# Altium footprint library SENSOR.PcbLib: 76 footprints (part 4 of 5)
Each footprint in its own frame and in the unit in brackets; x right, y up, seen from the top. Pads: shape width x height; smd on the part's side, far side on the other; paste and mask are expansions set on the pad; w line width, h text height; cw(c..) or ccw(c..) is an arc to the next point about the centre after c.
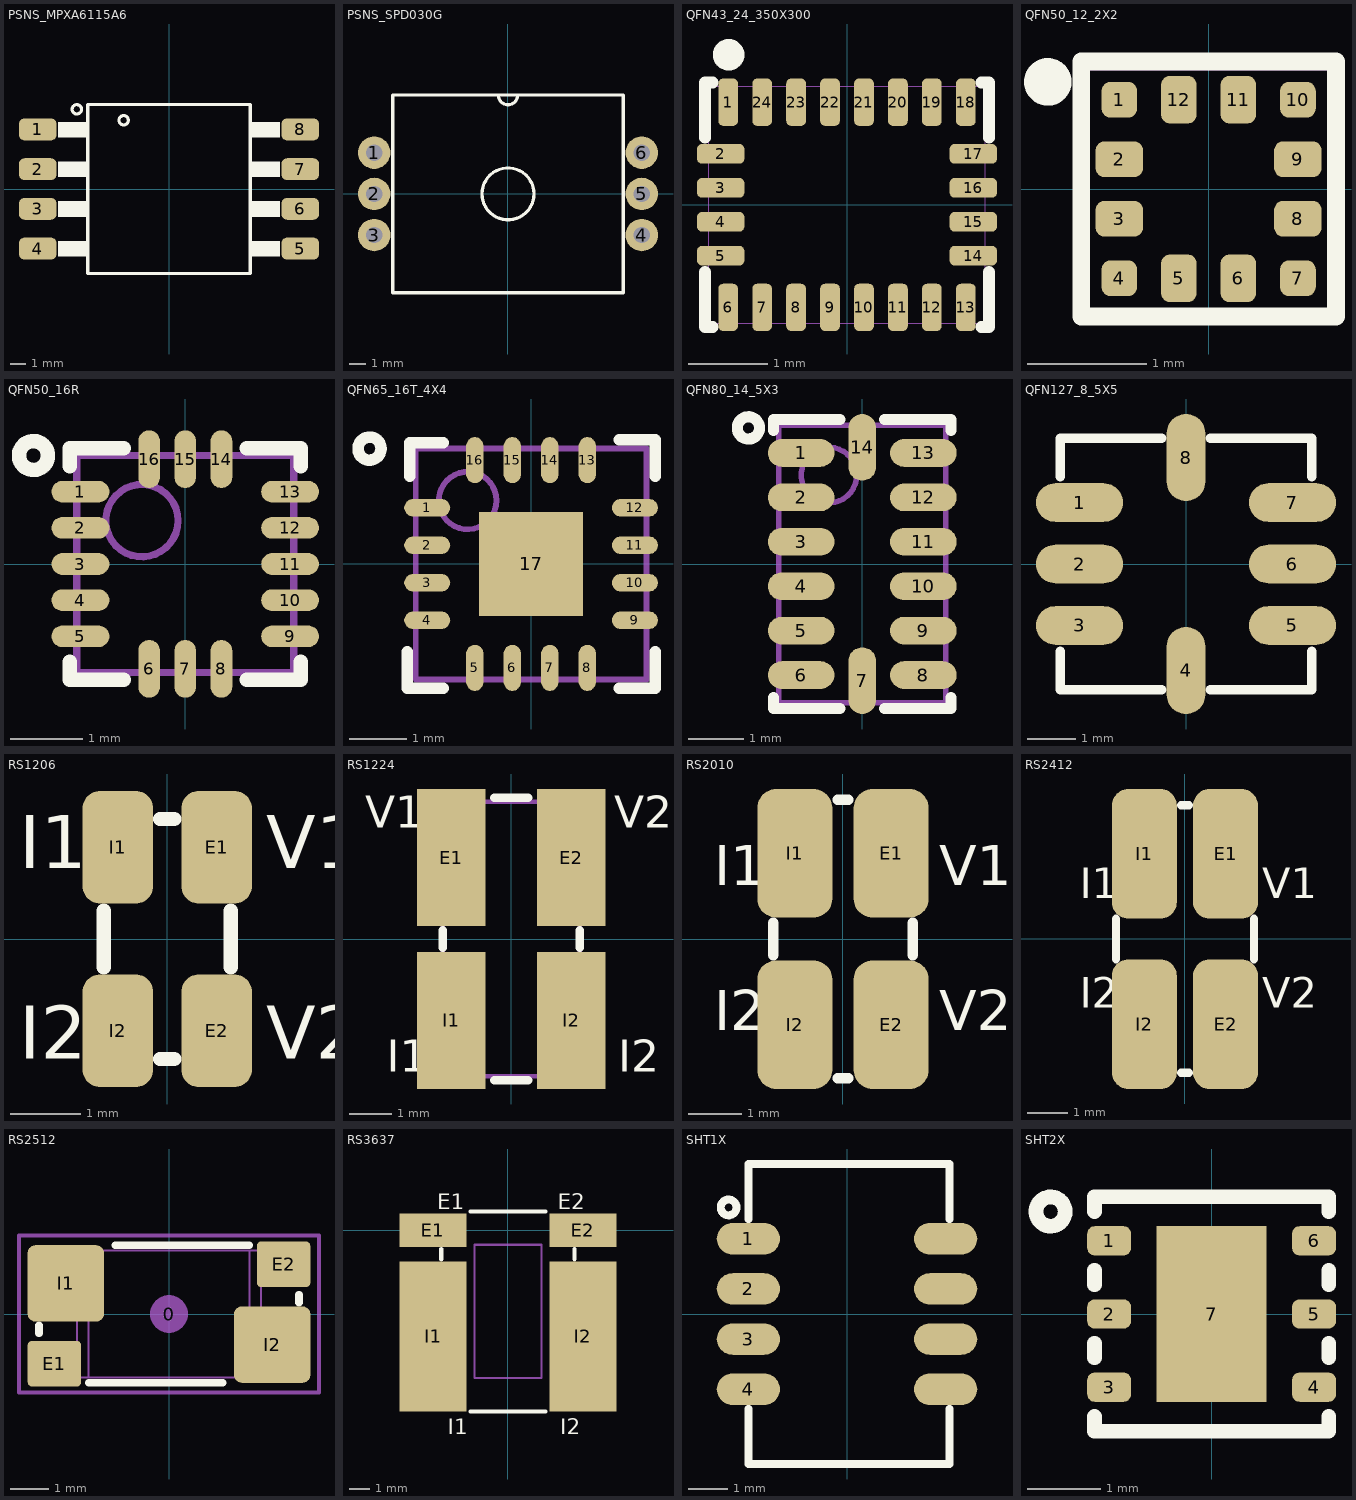
[diagram p3: the footprints below, top view; thin cyan lines are the x and y axes]

## PSNS_MPXA6115A6 [mm] "Pressure Sensor, MPXA6115A6"
pads (8):
  rrect50% 2.4x1.4 smd: 1(-8.4,3.81) 2(-8.4,1.27) 3(-8.4,-1.27) 4(-8.4,-3.81) 5(8.4,-3.81) 6(8.4,-1.27) 7(8.4,1.27) 8(8.4,3.81)
Top Overlay:
  circle w0.2: c-5.9,5.1 r0.3
  circle w0.2: c-2.9,4.4 r0.3
  region: 7.1,4.3 5.2,4.3 5.2,3.3 7.1,3.3
  region: 7.1,1.76 5.2,1.76 5.2,0.76 7.1,0.76
  region: 7.1,-0.78 5.2,-0.78 5.2,-1.78 7.1,-1.78
  region: 7.1,-3.32 5.2,-3.32 5.2,-4.32 7.1,-4.32
  rectangle: -7.1,-4.32 -5.2,-3.32
  rectangle: -7.1,-1.78 -5.2,-0.78
  rectangle: -7.1,0.76 -5.2,1.76
  rectangle: -7.1,3.3 -5.2,4.3
  lines w0.2: -5.2,-5.4 5.2,-5.4 5.2,5.4 -5.2,5.4 -5.2,-5.4
3D body "User Library-MPXV6115V.step": height 13, standoff 0, extent -9.1,-5.65 9.1,5.65

## PSNS_SPD030G [mm] "Pressure Sensor, SPD030G"
pads (6):
  round 2 hole 1: 1(-8.25,2.54) 2(-8.25,0) 3(-8.25,-2.54) 4(8.25,-2.54) 5(8.25,0) 6(8.25,2.54)
Top Overlay:
  circle w0.2: c0,0 r1.6
  lines w0.2: -0.6,6.1 ccw(c0,6.1) 0.6,6.1 ; -7.1,-6.1 -7.1,6.1 7.1,6.1 7.1,-6.1 -7.1,-6.1
3D body: height 4, standoff 0, extent -7,-6 7,6
3D body: height 15, standoff 3, extent -1.5,-1.498 1.5,1.499

## QFN43_24_350X300 [mm] "LGA (3.5x3x1 mm) 24-lead, LSM9DS1 gyro"
height 1
pads (24):
  rrect50% 0.25x0.6 smd paste-0.025 mask+0.05: 1(-1.505,1.3) 6(-1.505,-1.3) 7(-1.075,-1.3) 8(-0.645,-1.3) 9(-0.215,-1.3) 10(0.215,-1.3) 11(0.645,-1.3) 12(1.075,-1.3) 13(1.505,-1.3) 18(1.505,1.3) 19(1.075,1.3) 20(0.645,1.3) 21(0.215,1.3) 22(-0.215,1.3) 23(-0.645,1.3) 24(-1.075,1.3)
  rrect50% 0.6x0.25 smd paste-0.025 mask+0.05: 2(-1.6,0.645) 3(-1.6,0.215) 4(-1.6,-0.215) 5(-1.6,-0.645) 14(1.6,-0.645) 15(1.6,-0.215) 16(1.6,0.215) 17(1.6,0.645)
Top Overlay:
  circle w0.2: c-1.5,1.9 r0.1
  lines w0.15: -1.8,-0.85 -1.8,-1.55 -1.7,-1.55 ; -1.8,0.85 -1.8,1.55 -1.7,1.55 ; 1.7,-1.55 1.8,-1.55 1.8,-0.85 ; 1.7,1.55 1.8,1.55 1.8,0.85
Mechanical 13:
  lines w0.01: -1.75,-1.5 1.75,-1.5 1.75,1.5 -1.75,1.5 -1.75,-1.5
3D body: height 1.01, standoff 1, extent -1.4,0.7 -1,1.1
3D body: height 0.05, standoff 0, extent -0.335,1.05 -0.095,1.4
3D body: height 0.05, standoff 0, extent -1.625,1.05 -1.385,1.4
3D body: height 0.05, standoff 0, extent -1.195,1.05 -0.955,1.4
3D body: height 0.05, standoff 0, extent -0.765,1.05 -0.525,1.4
3D body: height 0.05, standoff 0, extent 0.955,1.05 1.195,1.4
3D body: height 0.05, standoff 0, extent 0.525,1.05 0.765,1.4
3D body: height 0.05, standoff 0, extent 0.095,1.05 0.335,1.4
3D body: height 0.05, standoff 0, extent 1.385,1.05 1.625,1.4
3D body: height 0.05, standoff 0, extent 1.385,-1.4 1.625,-1.05
3D body: height 0.05, standoff 0, extent 0.095,-1.4 0.335,-1.05
3D body: height 0.05, standoff 0, extent 0.525,-1.4 0.765,-1.05
3D body: height 0.05, standoff 0, extent 0.955,-1.4 1.195,-1.05
3D body: height 0.05, standoff 0, extent -0.765,-1.4 -0.525,-1.05
3D body: height 0.05, standoff 0, extent -1.195,-1.4 -0.955,-1.05
3D body: height 0.05, standoff 0, extent -1.625,-1.4 -1.385,-1.05
3D body: height 0.05, standoff 0, extent -0.335,-1.4 -0.095,-1.05
3D body: height 0.05, standoff 0, extent 1.35,-0.335 1.7,-0.095
3D body: height 0.05, standoff 0, extent 1.35,0.095 1.7,0.335
3D body: height 0.05, standoff 0, extent 1.35,0.525 1.7,0.765
3D body: height 0.05, standoff 0, extent 1.35,-0.765 1.7,-0.525
3D body: height 0.05, standoff 0, extent -1.7,-0.765 -1.35,-0.525
3D body: height 0.05, standoff 0, extent -1.7,0.525 -1.35,0.765
3D body: height 0.05, standoff 0, extent -1.7,0.095 -1.35,0.335
3D body: height 0.05, standoff 0, extent -1.7,-0.335 -1.35,-0.095
3D body: height 1, standoff 0.01, extent -1.75,-1.5 1.75,1.5

## QFN50_12_2X2 [mm] "LGA, 12-Leads, Body 2.00x2.00mmx1.00mm, Pitch 0.50mm"
height 1
pads (12):
  rrect50% 0.3x0.3 smd paste-0.05 mask+0.075: 1(-0.75,0.75) 4(-0.75,-0.75) 7(0.75,-0.75) 10(0.75,0.75)
  rrect50% 0.4x0.3 smd paste-0.05 mask+0.075: 2(-0.75,0.25) 3(-0.75,-0.25) 8(0.75,-0.25) 9(0.75,0.25)
  rrect50% 0.3x0.4 smd paste-0.05 mask+0.075: 5(-0.25,-0.75) 6(0.25,-0.75) 11(0.25,0.75) 12(-0.25,0.75)
Top Overlay:
  circle w0.2: c-1.35,0.9 r0.1
  lines w0.15: -1.07,-1.07 1.07,-1.07 1.07,1.07 -1.07,1.07 -1.07,-1.07
Mechanical 13:
  lines w0.01: -1,-1 1,-1 1,1 -1,1 -1,-1
3D body "User Library-lga-2x2x0_9.step": height 0.95, standoff 0, extent -1,-1 1,1

## QFN50_16R [mm] "TFLGA 3x3x1, 5+3+5+3, 3X3mm, 0.5mm pitch"
height 1
pads (16):
  oval 0.8x0.3 smd paste-0.05 mask+0.075: 1(-1.45,1) 2(-1.45,0.5) 3(-1.45,0) 4(-1.45,-0.5) 5(-1.45,-1) 9(1.45,-1) 10(1.45,-0.5) 11(1.45,0) 12(1.45,0.5) 13(1.45,1)
  oval 0.3x0.8 smd paste-0.05 mask+0.075: 6(-0.5,-1.45) 7(0,-1.45) 8(0.5,-1.45) 14(0.5,1.45) 15(0,1.45) 16(-0.5,1.45)
Top Overlay:
  circle w0.2: c-2.1,1.5 r0.2
  lines w0.2: -1.6,-1.35 -1.6,-1.6 -0.85,-1.6 ; -1.6,1.35 -1.6,1.6 -0.85,1.6 ; 0.85,-1.6 1.6,-1.6 1.6,-1.35 ; 0.85,1.6 1.6,1.6 1.6,1.35
Mechanical 13:
  circle w0.1: c-0.6,0.6 r0.5
  lines w0.1: -1.5,-1.5 1.5,-1.5 1.5,1.5 -1.5,1.5 -1.5,-1.5
3D body: height 1, standoff 0, extent -1.5,-1.5 1.5,1.5

## QFN65_16T_4X4 [mm] "QFN, 16-Leads, Body 4.00x4.00mm, Pitch 0.65mm, ADX330"
height 1.5
pads (17):
  oval 0.8x0.3 smd mask+0.075: 1(-1.8,0.975) 2(-1.8,0.325) 3(-1.8,-0.325) 4(-1.8,-0.975) 9(1.8,-0.975) 10(1.8,-0.325) 11(1.8,0.325) 12(1.8,0.975)
  oval 0.3x0.8 smd mask+0.075: 5(-0.975,-1.8) 6(-0.325,-1.8) 7(0.325,-1.8) 8(0.975,-1.8) 13(0.975,1.8) 14(0.325,1.8) 15(-0.325,1.8) 16(-0.975,1.8)
  rect 1.8x1.8 smd paste-0.1: 17(0,0)
Top Overlay:
  circle w0.2: c-2.8,2 r0.2
  lines w0.2: -2.15,-1.525 -2.15,-2.15 -1.525,-2.15 ; -2.1,1.525 -2.1,2.1 -1.525,2.1 ; 1.525,-2.15 2.15,-2.15 2.15,-1.525 ; 1.525,2.15 2.15,2.15 2.15,1.525
Mechanical 13:
  circle w0.1: c-1.1,1.1 r0.5
  lines w0.1: -2,-2 -2,2 2,2 2,-2 -2,-2
3D body "QFN65_16T_4X4.step": height 1.5, standoff 0, extent -2.02,-2.02 2.02,2.02

## QFN80_14_5X3 [mm] "QFN LGA 5.0X3.0mm, pitch: 0.8mm, ADXL345"
height 1
pads (14):
  oval 1.2x0.5 smd paste-0.05 mask+0.075: 1(-1.1,2) 2(-1.1,1.2) 3(-1.1,0.4) 4(-1.1,-0.4) 5(-1.1,-1.2) 6(-1.1,-2) 8(1.1,-2) 9(1.1,-1.2) 10(1.1,-0.4) 11(1.1,0.4) 12(1.1,1.2) 13(1.1,2)
  oval 0.5x1.2 smd paste-0.05 mask+0.075: 7(0,-2.1) 14(0,2.1)
Top Overlay:
  circle w0.2: c-2.05,2.45 r0.2
  lines w0.2: -1.6,-2.4 -1.6,-2.6 -0.4,-2.6 ; -1.6,2.4 -1.6,2.6 -0.4,2.6 ; 0.4,-2.6 1.6,-2.6 1.6,-2.4 ; 0.4,2.6 1.6,2.6 1.6,2.4
Mechanical 13:
  circle w0.1: c-0.6,1.6 r0.5
  lines w0.1: -1.5,-2.5 -1.5,2.5 1.5,2.5 1.5,-2.5 -1.5,-2.5
3D body "QFN80_14_5X3.step": height 1, standoff 0, extent -1.5,-2.5 1.5,2.5

## QFN127_8_5X5 [mm] "E-8-1, LCC 8, ADXL103, ADXL203"
pads (8):
  oval 1.8x0.8 smd paste-0.05: 1(-2.2,1.27) 2(-2.2,0) 3(-2.2,-1.27) 5(2.2,-1.27) 6(2.2,0) 7(2.2,1.27)
  oval 0.8x1.8 smd paste-0.05: 4(0,-2.2) 8(0,2.2)
Top Overlay:
  lines w0.2: -2.6,-1.8 -2.6,-2.6 -0.5,-2.6 ; -2.6,1.8 -2.6,2.6 -0.5,2.6 ; 0.5,-2.6 2.6,-2.6 2.6,-1.8 ; 0.5,2.6 2.6,2.6 2.6,1.8
3D body "User Library-LCC-8.step": height 1.55, standoff 0, extent -2.5,-2.5 2.5,2.5

## RS1206 [mm] "RESISTOR SHUNT SMD, 3.2X1.6mm, 1206, LVK12"
height 0.5
pads (4):
  rrect50% 1x1.6 smd: E1(0.7,1.3) E2(0.7,-1.3) I1(-0.7,1.3) I2(-0.7,-1.3)
Top Overlay:
  lines w0.2: -0.9,-0.4 -0.9,0.4 ; -0.1,-1.7 0.1,-1.7 ; -0.1,1.7 0.1,1.7 ; 0.9,-0.4 0.9,0.4
  text "V1" at 1.4,1 h0.75
  text "I1" at -2.1,1 h0.75
  text "V2" at 1.4,-1.7 h0.75
  text "I2" at -2.1,-1.7 h0.75
3D body "LVK12R010FER.stp": height 0.6, standoff 0.05, extent -0.8,-1.6 0.8,1.6

## RS1224 [mm] "RESISTOR SHUNT SMD, 6.4X3.2mm, 1224, LVK25R005FER"
pads (4):
  rect 1.6x3.2 smd: E1(-1.4,1.9) E2(1.4,1.9) I1(-1.4,-1.9) I2(1.4,-1.9)
Top Overlay:
  lines w0.2: -1.6,-0.2 -1.6,0.2 ; -0.4,-3.3 0.4,-3.3 ; -0.4,3.3 0.4,3.3 ; 1.6,-0.2 1.6,0.2
  text "V1" at -3.4,2.6 h0.75
  text "I1" at -2.9,-3.1 h0.75
  text "V2" at 2.4,2.6 h0.75
  text "I2" at 2.5,-3.1 h0.75
Mechanical 13:
  lines w0.1: -1.6,-3.2 1.6,-3.2 1.6,3.2 -1.6,3.2 -1.6,-3.2
3D body "User Library-LVK25-V2.step": height 0.67, standoff -0.05, extent -1.55,-3.2 1.55,3.211

## RS2010 [mm] "RESISTOR SHUNT SMD, 5X2.5mm, 2010, LVK20"
height 0.5
pads (4):
  rrect50% 1.4x2.4 smd: E1(0.9,1.6) E2(0.9,-1.6) I1(-0.9,1.6) I2(-0.9,-1.6)
Top Overlay:
  lines w0.2: -1.3,-0.3 -1.3,0.3 ; -0.1,-2.6 0.1,-2.6 ; -0.1,2.6 0.1,2.6 ; 1.3,-0.3 1.3,0.3
  text "I2" at -2.4,-1.7 h0.75
  text "V2" at 1.8,-1.7 h0.75
  text "I1" at -2.4,1 h0.75
  text "V1" at 1.8,1 h0.75
3D body "LVK20R010FER.stp": height 0.6, standoff 0.05, extent -1.245,-2.502 1.245,2.502

## RS2412 [mm] "RESISTOR SHUNT SMD, 6.4X3.2mm, 2412, LVK24"
height 0.5
pads (4):
  rrect50% 1.6x3.2 smd: E1(1,2.1) E2(1,-2.1) I1(-1,2.1) I2(-1,-2.1)
Top Overlay:
  lines w0.2: -1.7,-0.5 -1.7,0.5 ; -0.1,-3.3 0.1,-3.3 ; -0.1,3.3 0.1,3.3 ; 1.7,-0.5 1.7,0.5
  text "I2" at -2.6,-1.7 h0.75
  text "V2" at 1.9,-1.7 h0.75
  text "I1" at -2.6,1 h0.75
  text "V1" at 1.9,1 h0.75
3D body "LVK24R010FER.stp": height 0.6, standoff 0.05, extent -1.6,-3.2 1.6,3.201

## RS2512 [mm] "RESISTOR SHUNT SMD, 6.3x3.2mm, 2512"
height 0.89
pads (5):
  round 1 on Mech15: 0(0,0)
  rrect20% 1.4x1.2 smd paste-0.7: E1(-3,-1.3) E2(3,1.3)
  rrect20% 2x2 smd paste-1.1: I1(-2.7,0.8) I2(2.7,-0.8)
Top Overlay:
  lines w0.2: -3.4,-0.5 -3.4,-0.3 ; -2.1,-1.8 1.4,-1.8 ; -1.4,1.8 2.1,1.8 ; 3.4,0.3 3.4,0.5
Mechanical 13:
  circle w0.05: c0,0 r0.25
  lines w0.05: -2.106,-1.663 -2.106,1.663 ; 2.106,-1.663 2.106,1.663 ; -3.3,-1.663 -3.3,-0.813 -2.406,-0.813 -2.406,0.038 -3.3,0.038 -3.3,1.663 3.3,1.663 3.3,0.813 2.406,0.813 2.406,-0.038 3.3,-0.038 3.3,-1.663 -3.3,-1.663
Mechanical 15:
  lines w0.1: -3.925,-2.05 -3.925,2.05 3.925,2.05 3.925,-2.05 -3.925,-2.05
3D body "RESC6332X89_119T_KELVIN.STEP": height 0.88, standoff 0, extent -3.3,-1.662 3.3,1.663

## RS3637 [mm] "RESISTOR SHUNT SMD, 9.1X9.4mm, 3637"
pads (4):
  rect 3.2x1.6 smd: E1(-3.6,0) E2(3.6,0)
  rect 3.2x7.2 smd: I1(-3.6,-5.1) I2(3.6,-5.1)
Top Overlay:
  lines w0.2: -3.2,-1.4 -3.2,-0.9 ; -1.8,-8.7 1.8,-8.7 ; -1.8,0.9 1.8,0.9 ; 3.2,-1.4 3.2,-0.9
  text "E1" at -3.4,1 h0.75
  text "I1" at -2.9,-9.8 h0.75
  text "E2" at 2.4,1 h0.75
  text "I2" at 2.5,-9.8 h0.75
Mechanical 13:
  lines w0.1: -1.6,-7.1 1.6,-7.1 1.6,-0.7 -1.6,-0.7 -1.6,-7.1
3D body "User Library-WSL3637.step": height 0.64, standoff 0, extent -4.57,-8.6 4.57,0.8

## SHT1X [mm] "SENSIRION SHT1x humidity and temp sensor"
pads (8):
  oval 1.6x0.8 smd paste-0.05 mask+0.075: 1(-2.5,1.905) 2(-2.5,0.635) 3(-2.5,-0.635) 4(-2.5,-1.905) ""(2.5,-1.905) ""(2.5,-0.635) ""(2.5,0.635) ""(2.5,1.905)
Top Overlay:
  circle w0.2: c-3,2.7 r0.2
  lines w0.2: -2.5,-2.4 -2.5,-3.8 2.6,-3.8 2.6,-2.4 ; -2.5,2.4 -2.5,3.8 2.6,3.8 2.6,2.4
3D body "SHT1x.STEP": height 2.35, standoff -0.01, extent -2.43,-3.735 2.5,3.735

## SHT2X [mm] "SENSIRION SHT2X humidity and temp sensor 3X3x1.1mm"
height 1.1
pads (7):
  rrect50% 0.6x0.4 smd paste-0.05 mask+0.075: 1(-1.4,1) 2(-1.4,0) 3(-1.4,-1) 4(1.4,-1) 5(1.4,0) 6(1.4,1)
  rect 1.5x2.4 smd paste-0.05 mask+0.075: 7(0,0)
Top Overlay:
  circle w0.2: c-2.2,1.4 r0.2
  lines w0.2: -1.6,-1.4 -1.6,-1.6 1.6,-1.6 1.6,-1.4 ; -1.6,-0.6 -1.6,-0.4 ; -1.6,0.4 -1.6,0.6 ; -1.6,1.4 -1.6,1.6 1.6,1.6 1.6,1.4 ; 1.6,-0.6 1.6,-0.4 ; 1.6,0.4 1.6,0.6
3D body "SHT21.step": height 1.1, standoff -0.02, extent -1.51,-1.5 1.51,1.5